# Altium footprint library Connector_art.PcbLib: 209 footprints (part 4 of 14)
Each footprint in its own frame and in the unit in brackets; x right, y up, seen from the top. Pads: shape width x height; smd on the part's side, far side on the other; paste and mask are expansions set on the pad; w line width, h text height; cw(c..) or ccw(c..) is an arc to the next point about the centre after c.
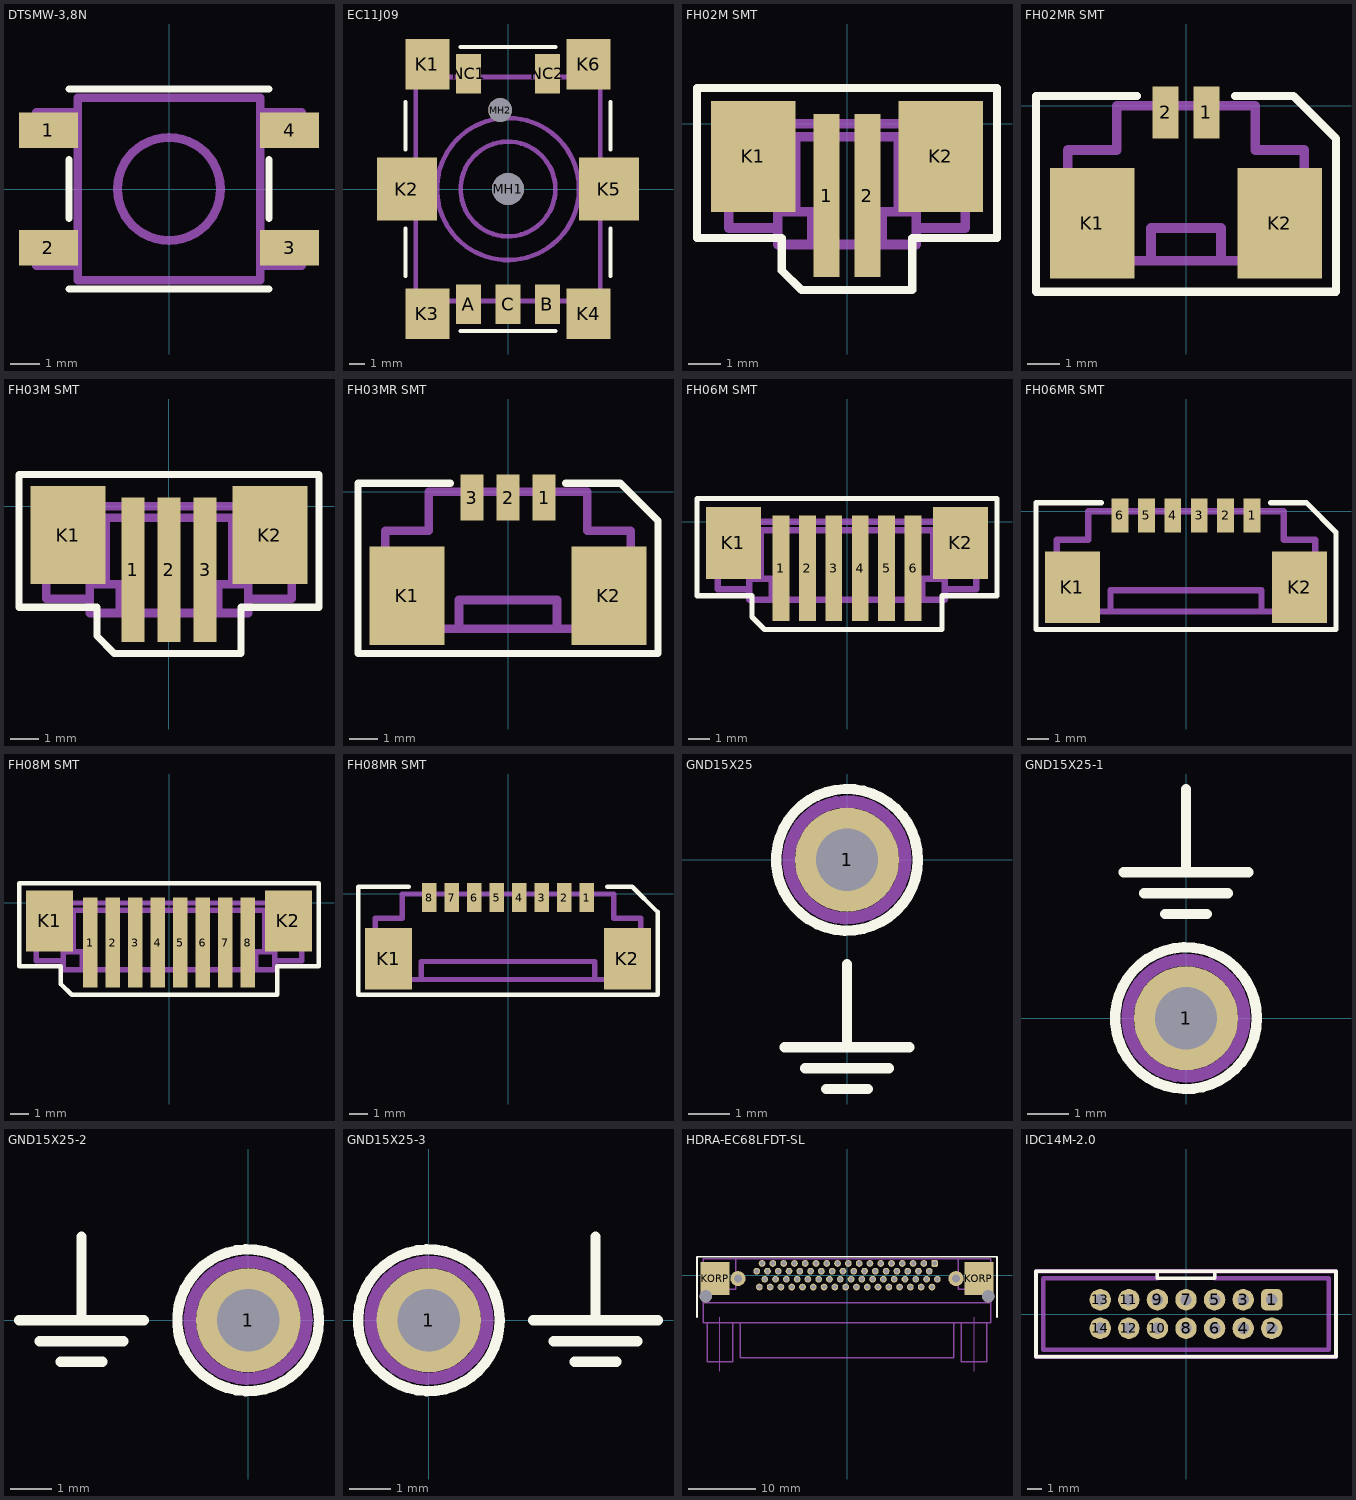
[diagram p3: the footprints below, top view; thin cyan lines are the x and y axes]

## DTSMW-3,8N [mm]
height 3
pads (4):
  rect 2x1.2 smd: 1(-4.1,2) 2(-4.1,-2) 3(4.1,-2) 4(4.1,2)
Top Overlay:
  lines w0.25: -3.4,-3.4 3.4,-3.4 ; -3.4,-1 -3.4,1 ; -3.4,3.4 3.4,3.4 ; 3.4,-1 3.4,1
Mechanical 1:
  circle w0.3: c0,0 r1.75
  lines w0.3: -3.1,-2.6 -4.5,-2.6 -4.5,-1.9 -3.1,-1.9 ; -3.1,1.9 -4.5,1.9 -4.5,2.6 -3.1,2.6 ; 3.1,-2.6 4.5,-2.6 4.5,-1.9 3.1,-1.9 ; 3.1,1.9 4.5,1.9 4.5,2.6 3.1,2.6 ; -3.1,-3.1 -3.1,3.1 3.1,3.1 3.1,-3.1 -3.1,-3.1
3D body: height 3.9, standoff 0, extent -4.5,-3 4.5,3

## EC11J09 [mm]
height 24.5
pads (13):
  rect 1.6x2.5 smd: A(-2.5,-7.3) B(2.5,-7.3) C(0,-7.3) NC1(-2.5,7.3) NC2(2.5,7.3)
  rect 2.8x3.2 smd: K1(-5.1,7.9) K3(-5.1,-7.9) K4(5.1,-7.9) K6(5.1,7.9)
  rect 3.8x4 smd: K2(-6.4,0) K5(6.4,0)
  round 2 hole 2 unplated: MH1(0,0)
  round 1.5 hole 1.5 unplated: MH2(-0.5,5)
Top Overlay:
  lines w0.25: -6.5,-5.5 -6.5,-2.5 ; -6.5,2.5 -6.5,5.5 ; -3,-9 3,-9 ; -3,9 3,9 ; 6.5,-5.5 6.5,-2.5 ; 6.5,2.5 6.5,5.5
Mechanical 1:
  circle w0.3: c0,0 r4.5
  circle w0.3: c0,0 r3
  lines w0.3: -5.85,-7.1 -5.85,7.1 5.85,7.1 5.85,-7.1 -5.85,-7.1
3D body: height 24.5, standoff -1.2, extent -7.5,-9 7.5,9

## FH02M SMT [mm]
height 4.75
pads (4):
  rect 0.8x5 smd: 1(-0.625,-2.2) 2(0.625,-2.2)
  rect 2.6x3.4 smd: K1(-2.875,-1) K2(2.875,-1)
Top Overlay:
  lines w0.25: -4.6,-3.5 -4.6,1.1 4.6,1.1 4.6,-3.5 2,-3.5 2,-5.1 -1.4,-5.1 -2,-4.5 -2,-3.5 -4.6,-3.5
Mechanical 1:
  lines w0.3: -2.125,-3.2 -3.625,-3.2 -3.625,0 3.625,0 3.625,-3.2 2.125,-3.2 ; -2.125,-2.7 -1.075,-2.7 -1.075,-3.7 ; -2.125,0 -2.125,-3.7 2.125,-3.7 2.125,0 ; -1.575,-2.7 -1.575,-0.4 1.575,-0.4 1.575,-2.7 ; 1.075,-3.7 1.075,-2.7 ; 2.125,-2.7 1.075,-2.7 ; 1.075,-2.7 1.075,-2.7
3D body: height 4.75, standoff 0, extent -3.625,-4.4 3.625,0

## FH02MR SMT [mm]
height 3.5
pads (4):
  rect 0.8x1.6 smd: 1(0.625,-0.2) 2(-0.625,-0.2)
  rect 2.6x3.4 smd: K1(-2.875,-3.6) K2(2.875,-3.6)
Top Overlay:
  lines w0.25: -1.5,0.3 -4.6,0.3 -4.6,-5.7 4.6,-5.7 4.6,-1 3.3,0.3 1.5,0.3
Mechanical 1:
  lines w0.3: -1.075,-4.75 -1.075,-3.75 1.075,-3.75 1.075,-4.75 ; -3.625,-4.75 -3.625,-1.35 -2.125,-1.35 -2.125,0 2.125,0 2.125,-1.35 3.625,-1.35 3.625,-4.75 -3.625,-4.75
3D body: height 3.4, standoff 0, extent -3.625,-4.75 3.625,0

## FH03M SMT [mm]
height 4.75
pads (5):
  rect 0.8x5 smd: 1(-1.25,-2.2) 2(0,-2.2) 3(1.25,-2.2)
  rect 2.6x3.4 smd: K1(-3.5,-1) K2(3.5,-1)
Top Overlay:
  lines w0.25: -5.2,-3.5 -2.5,-3.5 -2.5,-4.5 -1.9,-5.1 2.5,-5.1 2.5,-3.5 5.2,-3.5 5.2,1.1 -5.2,1.1 -5.2,-3.5
Mechanical 1:
  lines w0.3: -2.75,-3.2 -4.25,-3.2 -4.25,0 4.25,0 4.25,-3.2 2.75,-3.2 ; -2.75,-2.7 -1.7,-2.7 -1.7,-3.7 ; -2.75,0 -2.75,-3.7 2.75,-3.7 2.75,0 ; -2.2,-2.7 -2.2,-0.4 2.2,-0.4 2.2,-2.7 ; 1.7,-3.7 1.7,-2.7 ; 2.75,-2.7 1.7,-2.7 ; 1.7,-2.7 1.7,-2.7
3D body: height 4.75, standoff 0, extent -4.25,-4.4 4.25,0

## FH03MR SMT [mm]
height 3.5
pads (5):
  rect 0.8x1.6 smd: 1(1.25,-0.2) 2(0,-0.2) 3(-1.25,-0.2)
  rect 2.6x3.4 smd: K1(-3.5,-3.6) K2(3.5,-3.6)
Top Overlay:
  lines w0.25: -2,0.3 -5.2,0.3 -5.2,-5.6 5.2,-5.6 5.2,-1 3.9,0.3 2,0.3
Mechanical 1:
  lines w0.3: -1.7,-4.75 -1.7,-3.75 1.7,-3.75 1.7,-4.75 ; -4.25,-4.75 -4.25,-1.35 -2.75,-1.35 -2.75,0 2.75,0 2.75,-1.35 4.25,-1.35 4.25,-4.75 -4.25,-4.75
3D body: height 3.4, standoff 0, extent -4.25,-4.75 4.25,0

## FH06M SMT [mm]
height 4.75
pads (8):
  rect 0.8x5 smd: 1(-3.125,-2.2) 2(-1.875,-2.2) 3(-0.625,-2.2) 4(0.625,-2.2) 5(1.875,-2.2) 6(3.125,-2.2)
  rect 2.6x3.4 smd: K1(-5.375,-1) K2(5.375,-1)
Top Overlay:
  lines w0.25: -7.1,-3.5 -7.1,1.1 7.1,1.1 7.1,-3.5 4.5,-3.5 4.5,-5.1 -3.9,-5.1 -4.5,-4.5 -4.5,-3.5 -7.1,-3.5
Mechanical 1:
  lines w0.3: -4.625,-3.2 -6.125,-3.2 -6.125,0 6.125,0 6.125,-3.2 4.625,-3.2 ; -4.625,-2.7 -3.575,-2.7 -3.575,-3.7 ; -4.625,0 -4.625,-3.7 4.625,-3.7 4.625,0 ; -4.075,-2.7 -4.075,-0.4 4.075,-0.4 4.075,-2.7 ; 3.575,-3.7 3.575,-2.7 ; 4.625,-2.7 3.575,-2.7 ; 3.575,-2.7 3.575,-2.7
3D body: height 4.75, standoff 0, extent -6.125,-4.4 6.125,0

## FH06MR SMT [mm]
height 3.5
pads (8):
  rect 0.8x1.6 smd: 1(3.125,-0.2) 2(1.875,-0.2) 3(0.625,-0.2) 4(-0.625,-0.2) 5(-1.875,-0.2) 6(-3.125,-0.2)
  rect 2.6x3.4 smd: K1(-5.375,-3.6) K2(5.375,-3.6)
Top Overlay:
  lines w0.25: -4,0.4 -7.1,0.4 -7.1,-5.6 7.1,-5.6 7.1,-1 5.7,0.4 4,0.4
Mechanical 1:
  lines w0.3: -3.575,-4.75 -3.575,-3.75 3.575,-3.75 3.575,-4.75 ; -6.125,-4.75 6.125,-4.75 6.125,-1.35 4.625,-1.35 4.625,0 -4.625,0 -4.625,-1.35 -6.125,-1.35 -6.125,-4.75
3D body: height 3.4, standoff 0, extent -6.125,-4.75 6.125,0

## FH08M SMT [mm]
height 4.75
pads (10):
  rect 0.8x5 smd: 1(-4.375,-2.2) 2(-3.125,-2.2) 3(-1.875,-2.2) 4(-0.625,-2.2) 5(0.625,-2.2) 6(1.875,-2.2) 7(3.125,-2.2) 8(4.375,-2.2)
  rect 2.6x3.4 smd: K1(-6.625,-1) K2(6.625,-1)
Top Overlay:
  lines w0.25: -8.3,-3.5 -6,-3.5 -6,-4.5 -5.4,-5.1 6,-5.1 6,-3.5 8.3,-3.5 8.3,1.1 -8.3,1.1 -8.3,-3.5
Mechanical 1:
  lines w0.3: -5.875,-3.2 -7.375,-3.2 -7.375,0 7.375,0 7.375,-3.2 5.875,-3.2 ; -5.875,-2.7 -4.825,-2.7 -4.825,-3.7 ; -5.875,0 -5.875,-3.7 5.875,-3.7 5.875,0 ; -5.325,-2.7 -5.325,-0.4 5.325,-0.4 5.325,-2.7 ; 4.825,-3.7 4.825,-2.7 ; 5.875,-2.7 4.825,-2.7 ; 4.825,-2.7 4.825,-2.7
3D body: height 4.75, standoff 0, extent -7.375,-4.4 7.375,0

## FH08MR SMT [mm]
height 3.5
pads (10):
  rect 0.8x1.6 smd: 1(4.375,-0.2) 2(3.125,-0.2) 3(1.875,-0.2) 4(0.625,-0.2) 5(-0.625,-0.2) 6(-1.875,-0.2) 7(-3.125,-0.2) 8(-4.375,-0.2)
  rect 2.6x3.4 smd: K1(-6.625,-3.6) K2(6.625,-3.6)
Top Overlay:
  lines w0.25: -5.5,0.4 -8.3,0.4 -8.3,-5.6 8.3,-5.6 8.3,-1 6.9,0.4 5.5,0.4
Mechanical 1:
  lines w0.3: -4.825,-4.75 -4.825,-3.75 4.825,-3.75 4.825,-4.75 ; -7.375,-4.75 7.375,-4.75 7.375,-1.35 5.875,-1.35 5.875,0 -5.875,0 -5.875,-1.35 -7.375,-1.35 -7.375,-4.75
3D body: height 3.4, standoff 0, extent -7.375,-4.75 7.375,0

## GND15X25 [mm]
pads (1):
  round 2.5 hole 1.5: 1(0,0)
Top Overlay:
  circle w0.25: c0,0 r1.7
  lines w0.25: -1.5,-4.5 1.5,-4.5 ; -1,-5 1,-5 ; -0.5,-5.5 0.5,-5.5 ; 0,-4.5 0,-2.5
Bottom Overlay:
  circle w0.25: c0,0 r1.7
  lines w0.25: -1.5,-4.5 1.5,-4.5 ; -1,-5 1,-5 ; -0.5,-5.5 0.5,-5.5 ; 0,-4.5 0,-2.5
Mechanical 1:
  circle w0.3: c0,0 r1.4

## GND15X25-1 [mm]
pads (1):
  round 2.5 hole 1.5: 1(0,0)
Top Overlay:
  circle w0.25: c0,0 r1.7
  lines w0.25: -1.5,3.5 1.5,3.5 ; -1,3 1,3 ; -0.5,2.5 0.5,2.5 ; 0,3.5 0,5.5
Bottom Overlay:
  circle w0.25: c0,0 r1.7
  lines w0.25: -1.5,3.5 1.5,3.5 ; -1,3 1,3 ; -0.5,2.5 0.5,2.5 ; 0,3.5 0,5.5
Mechanical 1:
  circle w0.3: c0,0 r1.4

## GND15X25-2 [mm]
pads (1):
  round 2.5 hole 1.5: 1(0,0)
Top Overlay:
  circle w0.25: c0,0 r1.7
  lines w0.25: -5.5,0 -2.5,0 ; -5,-0.5 -3,-0.5 ; -4.5,-1 -3.5,-1 ; -4,0 -4,2
Bottom Overlay:
  circle w0.25: c0,0 r1.7
  lines w0.25: -5.5,0 -2.5,0 ; -5,-0.5 -3,-0.5 ; -4.5,-1 -3.5,-1 ; -4,0 -4,2
Mechanical 1:
  circle w0.3: c0,0 r1.4

## GND15X25-3 [mm]
pads (1):
  round 2.5 hole 1.5: 1(0,0)
Top Overlay:
  circle w0.25: c0,0 r1.7
  lines w0.25: 2.5,0 5.5,0 ; 3,-0.5 5,-0.5 ; 3.5,-1 4.5,-1 ; 4,0 4,2
Bottom Overlay:
  circle w0.25: c0,0 r1.7
  lines w0.25: 2.5,0 5.5,0 ; 3,-0.5 5,-0.5 ; 3.5,-1 4.5,-1 ; 4,0 4,2
Mechanical 1:
  circle w0.3: c0,0 r1.4

## HDRA-EC68LFDT-SL [mm]
height 6
pads (74):
  rrect50% 1x1 hole 0.65: 1(13,1.75)
  round 1 hole 0.65: 2(12.2,0.6) 3(11.4,1.75) 4(10.6,0.6) 5(9.8,1.75) 6(9,0.6) 7(8.2,1.75) 8(7.4,0.6) 9(6.6,1.75) 10(5.8,0.6) 11(5,1.75) 12(4.2,0.6) 13(3.4,1.75) 14(2.6,0.6) 15(1.8,1.75) 16(1,0.6) 17(0.2,1.75) 18(-0.6,0.6) 19(-1.4,1.75) 20(-2.2,0.6) 21(-3,1.75) 22(-3.8,0.6) 23(-4.6,1.75) 24(-5.4,0.6) 25(-6.2,1.75) 26(-7,0.6) 27(-7.8,1.75) 28(-8.6,0.6) 29(-9.4,1.75) 30(-10.2,0.6) 31(-11,1.75) 32(-11.8,0.6) 33(-12.6,1.75) 34(-13.4,0.6) 35(13.4,-0.6) 36(12.6,-1.75) 37(11.8,-0.6) 38(11,-1.75) 39(10.2,-0.6) 40(9.4,-1.75) 41(8.6,-0.6) 42(7.8,-1.75) 43(7,-0.6) 44(6.2,-1.75) 45(5.4,-0.6) 46(4.6,-1.75) 47(3.8,-0.6) 48(3,-1.75) 49(2.2,-0.6) 50(1.4,-1.75) 51(0.6,-0.6) 52(-0.2,-1.75) 53(-1,-0.6) 54(-1.8,-1.75) 55(-2.6,-0.6) 56(-3.4,-1.75) 57(-4.2,-0.6) 58(-5,-1.75) 59(-5.8,-0.6) 60(-6.6,-1.75) 61(-7.4,-0.6) 62(-8.2,-1.75) 63(-9,-0.6) 64(-9.8,-1.75) 65(-10.6,-0.6) 66(-11.4,-1.75) 67(-12.2,-0.6) 68(-13,-1.75)
  rect 4.3x4.9 smd: KORP(-19.575,-0.5) KORP(19.575,-0.5)
  round 2.25 hole 1.2: MH12(-16.175,-0.5) MH12(16.175,-0.5)
  round 1.8 hole 1.8 unplated: MH18(-20.95,-3.125) MH18(20.95,-3.125)
Top Overlay:
  lines w0.25: -22.25,-6.25 -22.25,2.75 22.25,2.75 22.25,-6.25
Mechanical 1:
  lines w0.1: -18.85,-14.25 -18.85,-6.25 ; 18.85,-14.25 18.85,-6.25
  lines w0.2: -21.35,-4.05 21.35,-4.05 ; -21.35,-2.05 -16.5,-2.05 -16.5,2.45 ; -20.75,-7.05 -20.75,-12.85 -16.95,-12.85 -16.95,-7.05 ; -15.8,-7.05 -15.8,-12.25 15.8,-12.25 15.8,-7.05 ; 16.5,2.45 16.5,-2.05 21.35,-2.05 ; 16.95,-7.05 16.95,-12.85 20.75,-12.85 20.75,-7.05 ; -21.35,-7.05 -21.35,2.45 21.35,2.45 21.35,-7.05 -21.35,-7.05
  text "68" at -15.25,-2.25 h1.5
  text "67" at -14,-1 h1.5
  text "34" at -15.25,0 h1.5
  text "33" at -14.5,1.25 h1.5
  text "36" at 13.25,-2.25 h1.5
  text "35" at 14.25,-1 h1.5
  text "2" at 13,0 h1.5
  text "1" at 14.25,1.25 h1.5
3D body: height 5.91, standoff -3.99, extent -21.35,-12.9 21.35,2.7

## IDC14M-2.0 [mm]
height 5.65
pads (14):
  rrect50% 1.5x1.5 hole 0.8: 1(6,1)
  round 1.5 hole 0.8: 2(6,-1) 3(4,1) 4(4,-1) 5(2,1) 6(2,-1) 7(0,1) 8(0,-1) 9(-2,1) 10(-2,-1) 11(-4,1) 12(-4,-1) 13(-6,1) 14(-6,-1)
Top Overlay:
  lines w0.25: -2,3 -2,2.5 2,2.5 2,3 ; -10.5,-3 10.5,-3 10.5,3 -10.5,3 -10.5,-3
Mechanical 1:
  lines w0.25: -2,2.5 -2,3 ; 2,2.5 2,3
  lines w0.3: -2,2.5 -10,2.5 -10,-2.5 10,-2.5 10,2.5 2,2.5 ; -10.5,-3 10.5,-3 10.5,3 -10.5,3 -10.5,-3
3D body: height 5.65, standoff -2.9, extent -10.5,-2.725 10.5,2.825